# Altium footprint library EG4S20BG256.PcbLib: 33 footprints (part 3 of 3)
Each footprint in its own frame and in the unit in brackets; x right, y up, seen from the top. Pads: shape width x height; smd on the part's side, far side on the other; paste and mask are expansions set on the pad; w line width, h text height; cw(c..) or ccw(c..) is an arc to the next point about the centre after c.
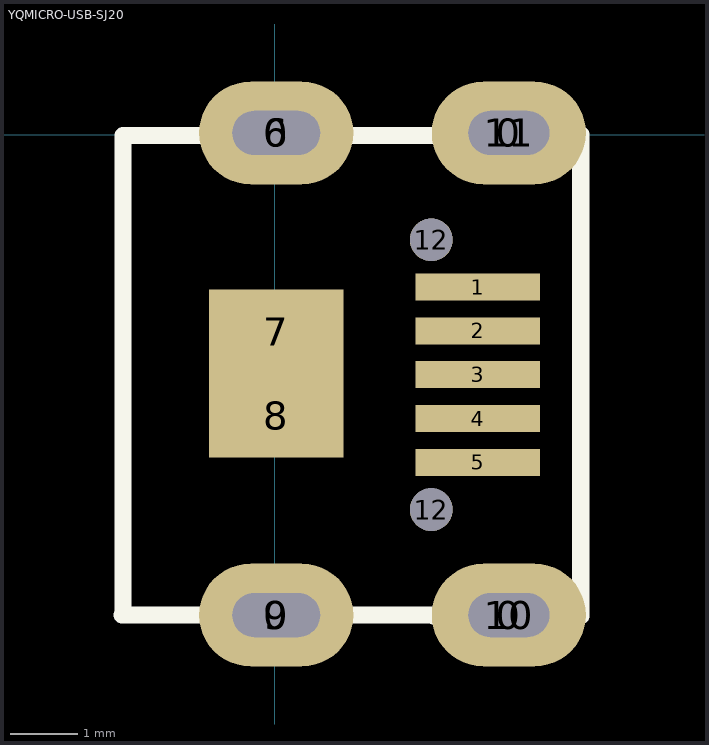
[diagram p2: the footprint, top view; thin cyan lines are the x and y axes]

## YQMICRO-USB-SJ20 [mil] "MICRO-USB-SJ20"
height 219
pads (17):
  oval 90x60 on Top Paste: 0(1,-280.5) 0(1,1) 0(136.81,-280.5) 0(136.81,1)
  rect 72.83x15.75 smd: 1(118.72,-88.96) 2(118.72,-114.55) 3(118.72,-140.14) 4(118.72,-165.73) 5(118.72,-191.32)
  oval 90x60 hole 25.59 slot 51.18 at 0 deg: 6(1,1) 9(1,-280.5)
  rect 78.74x49.21 smd: 7(1,-115.14) 8(1,-164)
  oval 90x60 hole 25.59 slot 47.24 at 0 deg: 10(136.81,-280.5) 11(136.81,1)
  round 25 hole 25: 12(91.54,-218.9) 12(91.54,-61.42)
Top Overlay:
  lines w10: 92.91,-281.1 178.74,-281.1 178.74,0 100.79,0 ; 107.85,-280.5 -89,-280.5 -88.37,-279.87 -88.37,-0.5 108.48,-0.5